# Altium footprint library Package_DFN_QFN.PcbLib: 557 footprints (part 13 of 35)
Each footprint in its own frame and in the unit in brackets; x right, y up, seen from the top. Pads: shape width x height; smd on the part's side, far side on the other; paste and mask are expansions set on the pad; w line width, h text height; cw(c..) or ccw(c..) is an arc to the next point about the centre after c.
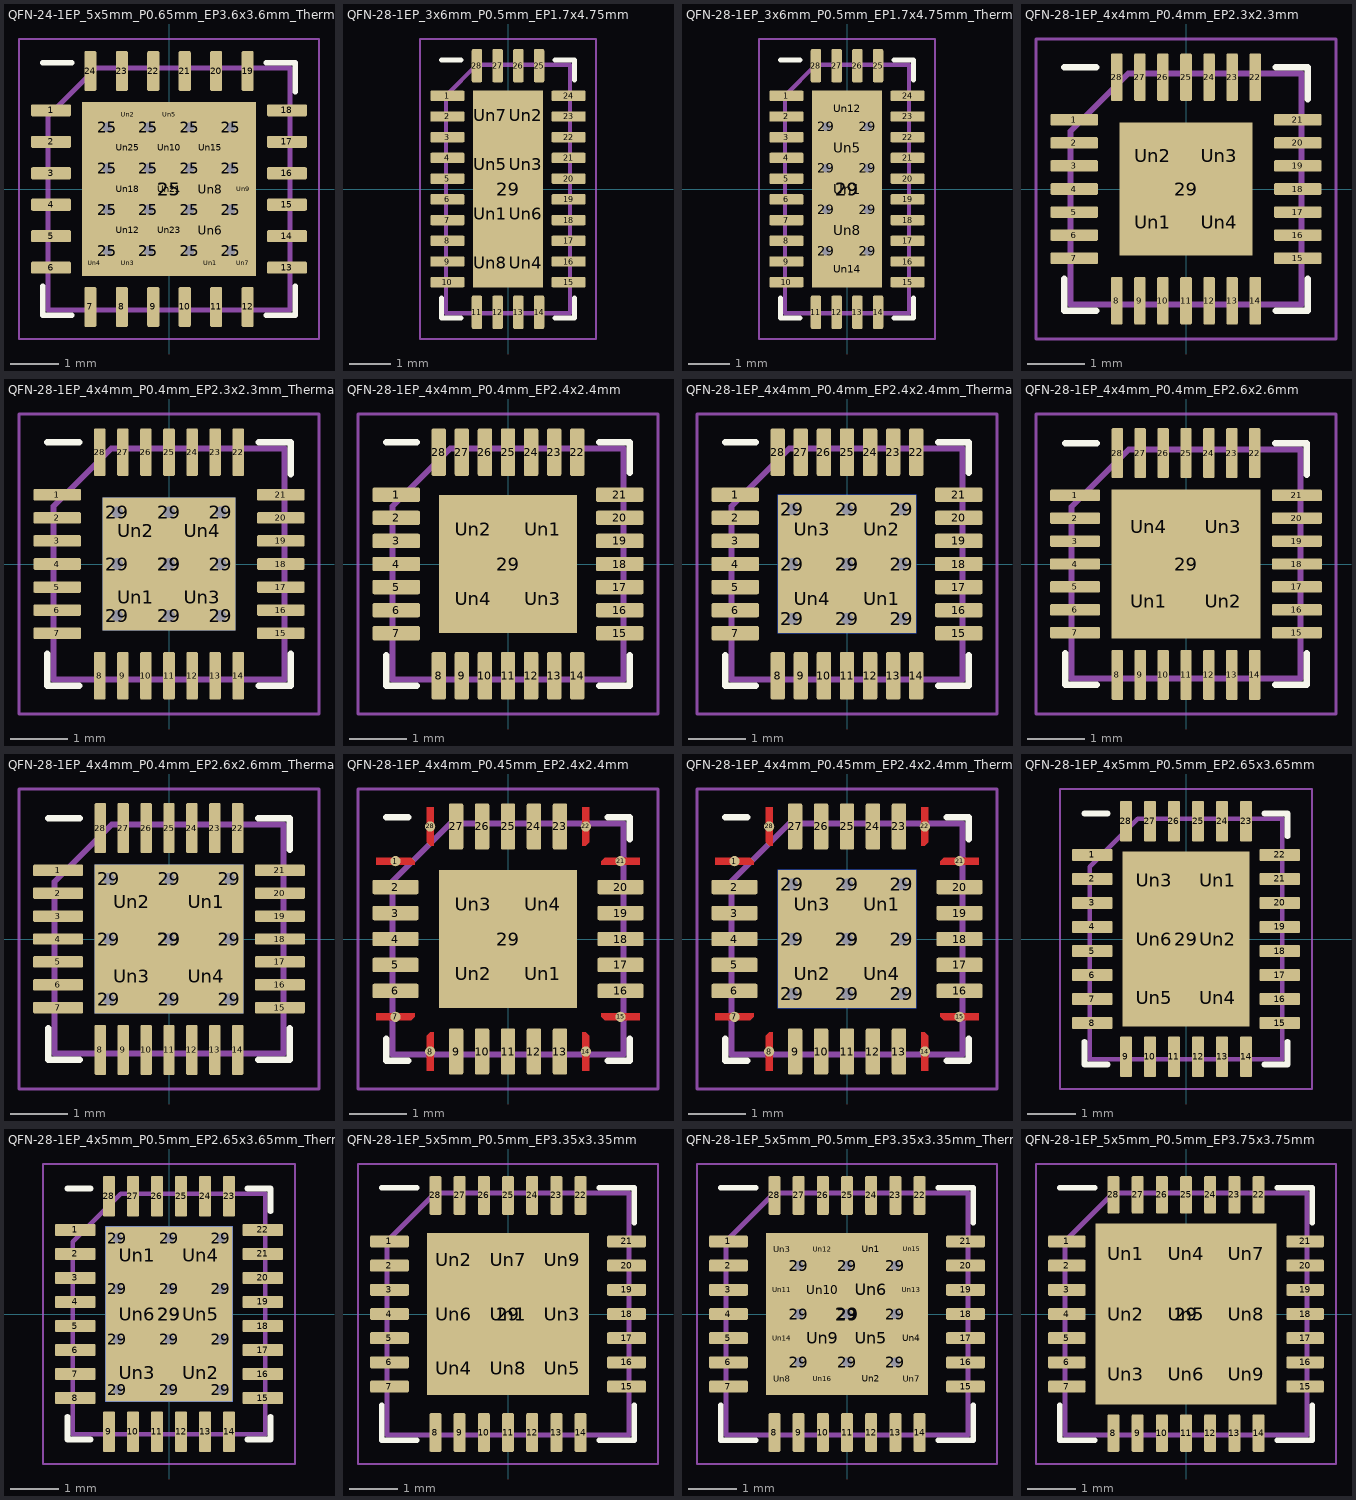
[diagram p12: the footprints below, top view; thin cyan lines are the x and y axes]

## QFN-24-1EP_5x5mm_P0.65mm_EP3.6x3.6mm_ThermalVias [mm]
pads (67):
  rrect25% 0.825x0.25 smd: 1(-2.438,1.625) 2(-2.438,0.975) 3(-2.438,0.325) 4(-2.438,-0.325) 5(-2.438,-0.975) 6(-2.438,-1.625) 13(2.438,-1.625) 14(2.438,-0.975) 15(2.438,-0.325) 16(2.438,0.325) 17(2.438,0.975) 18(2.438,1.625)
  rrect25% 0.25x0.825 smd: 7(-1.625,-2.438) 8(-0.975,-2.438) 9(-0.325,-2.438) 10(0.325,-2.438) 11(0.975,-2.438) 12(1.625,-2.438) 19(1.625,2.438) 20(0.975,2.438) 21(0.325,2.438) 22(-0.325,2.438) 23(-0.975,2.438) 24(-1.625,2.438)
  round 0.5 hole 0.2: 25(-1.275,-1.275) 25(-1.275,-0.425) 25(-1.275,0.425) 25(-1.275,1.275) 25(-0.425,-1.275) 25(-0.425,-0.425) 25(-0.425,0.425) 25(-0.425,1.275) 25(0.425,-1.275) 25(0.425,-0.425) 25(0.425,0.425) 25(0.425,1.275) 25(1.275,-1.275) 25(1.275,-0.425) 25(1.275,0.425) 25(1.275,1.275)
  rect 3.05x3.05 smd far side: 25(0,0)
  rect 3.6x3.6 smd: 25(0,0)
  round 0.317 on Top Paste: Un1(0.85,-1.538) Un2(-0.85,1.538) Un3(-0.85,-1.538) Un5(0,1.538) Un9(1.538,0) Un11(-1.538,0.85) Un13(1.538,0.85) Un14(1.538,-0.85) Un16(0,-1.538) Un17(-1.538,-0.85) Un19(-1.538,0) Un20(0.85,1.538)
  round 0.295 on Top Paste: Un4(-1.538,-1.538) Un7(1.538,-1.538) Un22(1.538,1.538) Un24(-1.538,1.538)
  round 0.602 on Top Paste: Un6(0.85,-0.85) Un8(0.85,0) Un10(0,0.85) Un12(-0.85,-0.85) Un15(0.85,0.85) Un18(-0.85,0) Un21(0,0) Un23(0,-0.85) Un25(-0.85,0.85)
F.SilkS:
  lines w0.12: -2.61,-2.01 -2.61,-2.61 -2.01,-2.61 ; -2.61,2.61 -2.01,2.61 ; 2.01,-2.61 2.61,-2.61 2.61,-2.01 ; 2.01,2.61 2.61,2.61 2.61,2.01
F.Paste:
  drawing of 25 lines, arcs and shapes, not listed
F.CrtYd:
  lines w0.05: -3.1,-3.1 -3.1,3.1 3.1,3.1 3.1,-3.1 -3.1,-3.1
F.Fab:
  lines w0.1: -2.5,-2.5 -2.5,1.5 -1.5,2.5 2.5,2.5 2.5,-2.5 -2.5,-2.5
  text "'.Designator'" at -4.047,-0.84 h1

## QFN-28-1EP_3x6mm_P0.5mm_EP1.7x4.75mm [mm]
pads (37):
  rrect25% 0.825x0.25 smd: 1(-1.462,2.25) 2(-1.462,1.75) 3(-1.462,1.25) 4(-1.462,0.75) 5(-1.462,0.25) 6(-1.462,-0.25) 7(-1.462,-0.75) 8(-1.462,-1.25) 9(-1.462,-1.75) 10(-1.462,-2.25) 15(1.462,-2.25) 16(1.462,-1.75) 17(1.462,-1.25) 18(1.462,-0.75) 19(1.462,-0.25) 20(1.462,0.25) 21(1.462,0.75) 22(1.462,1.25) 23(1.462,1.75) 24(1.462,2.25)
  rrect25% 0.25x0.8 smd: 11(-0.75,-2.975) 12(-0.25,-2.975) 13(0.25,-2.975) 14(0.75,-2.975) 25(0.75,2.975) 26(0.25,2.975) 27(-0.25,2.975) 28(-0.75,2.975)
  rect 1.7x4.75 smd: 29(0,0)
  rrect25% 0.69x0.96 on Top Paste: Un1(-0.425,-0.595) Un2(0.425,1.785) Un3(0.425,0.595) Un4(0.425,-1.785) Un5(-0.425,0.595) Un6(0.425,-0.595) Un7(-0.425,1.785) Un8(-0.425,-1.785)
F.SilkS:
  lines w0.12: -1.61,-2.635 -1.61,-3.11 -1.135,-3.11 ; -1.61,3.11 -1.135,3.11 ; 1.135,-3.11 1.61,-3.11 1.61,-2.635 ; 1.135,3.11 1.61,3.11 1.61,2.635
F.CrtYd:
  lines w0.05: -2.12,-3.62 2.12,-3.62 2.12,3.62 -2.12,3.62 -2.12,-3.62
F.Fab:
  lines w0.1: -1.5,-3 1.5,-3 1.5,3 -0.75,3 -1.5,2.25 -1.5,-3
  text "'.Designator'" at -3.033,-0.628 h0.75

## QFN-28-1EP_3x6mm_P0.5mm_EP1.7x4.75mm_ThermalVias [mm]
pads (53):
  rrect25% 0.825x0.25 smd: 1(-1.462,2.25) 2(-1.462,1.75) 3(-1.462,1.25) 4(-1.462,0.75) 5(-1.462,0.25) 6(-1.462,-0.25) 7(-1.462,-0.75) 8(-1.462,-1.25) 9(-1.462,-1.75) 10(-1.462,-2.25) 15(1.462,-2.25) 16(1.462,-1.75) 17(1.462,-1.25) 18(1.462,-0.75) 19(1.462,-0.25) 20(1.462,0.25) 21(1.462,0.75) 22(1.462,1.25) 23(1.462,1.75) 24(1.462,2.25)
  rrect25% 0.25x0.8 smd: 11(-0.75,-2.975) 12(-0.25,-2.975) 13(0.25,-2.975) 14(0.75,-2.975) 25(0.75,2.975) 26(0.25,2.975) 27(-0.25,2.975) 28(-0.75,2.975)
  round 0.5 hole 0.2: 29(-0.5,-1.5) 29(-0.5,-0.5) 29(-0.5,0.5) 29(-0.5,1.5) 29(0.5,-1.5) 29(0.5,-0.5) 29(0.5,0.5) 29(0.5,1.5)
  rect 1.5x3.5 smd far side: 29(0,0)
  rect 1.7x4.75 smd: 29(0,0)
  rrect25% 0.806x0.806 on Top Paste: Un1(0,0) Un5(0,1) Un8(0,-1)
  round 0.175 on Top Paste: Un2(-0.675,1) Un7(0.675,-1) Un9(0.675,0) Un10(-0.675,0) Un13(-0.675,-1) Un15(0.675,1)
  round 0.166 on Top Paste: Un3(0.675,1.937) Un4(-0.675,-1.937) Un6(0.675,-1.937) Un11(-0.675,1.937)
  rrect25% 0.806x0.705 on Top Paste: Un12(0,1.937) Un14(0,-1.937)
F.SilkS:
  lines w0.12: -1.61,-2.635 -1.61,-3.11 -1.135,-3.11 ; -1.61,3.11 -1.135,3.11 ; 1.135,-3.11 1.61,-3.11 1.61,-2.635 ; 1.135,3.11 1.61,3.11 1.61,2.635
F.Paste:
  region: -0.599,1.224 -0.599,0.776 -0.713,0.662 -0.751,0.662 -0.751,1.338 -0.713,1.338
  region: 0.757,1.644 0.723,1.644 0.593,1.773 0.593,2.231 0.757,2.231
  region: -0.593,-1.773 -0.593,-2.231 -0.757,-2.231 -0.757,-1.644 -0.723,-1.644
  region: 0.757,-2.231 0.593,-2.231 0.593,-1.773 0.723,-1.644 0.757,-1.644
  region: 0.751,-1.338 0.713,-1.338 0.599,-1.224 0.599,-0.776 0.713,-0.662 0.751,-0.662
  region: 0.751,-0.338 0.713,-0.338 0.599,-0.224 0.599,0.224 0.713,0.338 0.751,0.338
  region: -0.599,0.224 -0.599,-0.224 -0.713,-0.338 -0.751,-0.338 -0.751,0.338 -0.713,0.338
  region: -0.593,1.773 -0.723,1.644 -0.757,1.644 -0.757,2.231 -0.593,2.231
  region: -0.599,-0.776 -0.599,-1.224 -0.713,-1.338 -0.751,-1.338 -0.751,-0.662 -0.713,-0.662
  region: 0.751,0.662 0.713,0.662 0.599,0.776 0.599,1.224 0.713,1.338 0.751,1.338
F.CrtYd:
  lines w0.05: -2.12,-3.62 2.12,-3.62 2.12,3.62 -2.12,3.62 -2.12,-3.62
F.Fab:
  lines w0.1: -1.5,-3 -1.5,2.25 -0.75,3 1.5,3 1.5,-3 -1.5,-3
  text "'.Designator'" at -3.033,-0.628 h0.75

## QFN-28-1EP_4x4mm_P0.4mm_EP2.3x2.3mm [mm]
pads (33):
  rrect25% 0.825x0.2 smd: 1(-1.937,1.2) 2(-1.937,0.8) 3(-1.937,0.4) 4(-1.937,0) 5(-1.937,-0.4) 6(-1.937,-0.8) 7(-1.937,-1.2) 15(1.937,-1.2) 16(1.937,-0.8) 17(1.937,-0.4) 18(1.937,0) 19(1.937,0.4) 20(1.937,0.8) 21(1.937,1.2)
  rrect25% 0.2x0.825 smd: 8(-1.2,-1.937) 9(-0.8,-1.937) 10(-0.4,-1.937) 11(0,-1.937) 12(0.4,-1.937) 13(0.8,-1.937) 14(1.2,-1.937) 22(1.2,1.937) 23(0.8,1.937) 24(0.4,1.937) 25(0,1.937) 26(-0.4,1.937) 27(-0.8,1.937) 28(-1.2,1.937)
  rect 2.3x2.3 smd: 29(0,0)
  rrect25% 0.93x0.93 on Top Paste: Un1(-0.575,-0.575) Un2(-0.575,0.575) Un3(0.575,0.575) Un4(0.575,-0.575)
F.SilkS:
  lines w0.12: -2.11,-1.56 -2.11,-2.11 -1.56,-2.11 ; -2.11,2.11 -1.56,2.11 ; 1.56,-2.11 2.11,-2.11 2.11,-1.56 ; 1.56,2.11 2.11,2.11 2.11,1.56
F.CrtYd:
  lines w0.05: -2.6,-2.6 -2.6,2.6 2.6,2.6 2.6,-2.6 -2.6,-2.6
F.Fab:
  lines w0.1: -2,-2 2,-2 2,2 -1,2 -2,1 -2,-2
  text "'.Designator'" at -4.047,-0.84 h1

## QFN-28-1EP_4x4mm_P0.4mm_EP2.3x2.3mm_ThermalVias [mm]
pads (43):
  rrect25% 0.825x0.2 smd: 1(-1.937,1.2) 2(-1.937,0.8) 3(-1.937,0.4) 4(-1.937,0) 5(-1.937,-0.4) 6(-1.937,-0.8) 7(-1.937,-1.2) 15(1.937,-1.2) 16(1.937,-0.8) 17(1.937,-0.4) 18(1.937,0) 19(1.937,0.4) 20(1.937,0.8) 21(1.937,1.2)
  rrect25% 0.2x0.825 smd: 8(-1.2,-1.937) 9(-0.8,-1.937) 10(-0.4,-1.937) 11(0,-1.937) 12(0.4,-1.937) 13(0.8,-1.937) 14(1.2,-1.937) 22(1.2,1.937) 23(0.8,1.937) 24(0.4,1.937) 25(0,1.937) 26(-0.4,1.937) 27(-0.8,1.937) 28(-1.2,1.937)
  round 0.5 hole 0.2: 29(-0.9,-0.9) 29(-0.9,0) 29(-0.9,0.9) 29(0,-0.9) 29(0,0) 29(0,0.9) 29(0.9,-0.9) 29(0.9,0) 29(0.9,0.9)
  rect 2.3x2.3 smd: 29(0,0)
  rect 2.3x2.3 smd far side: 29(0,0)
  rrect25% 1x1 on Top Paste: Un1(-0.575,-0.575) Un2(-0.575,0.575) Un3(0.575,-0.575) Un4(0.575,0.575)
F.SilkS:
  lines w0.12: -2.11,-1.56 -2.11,-2.11 -1.56,-2.11 ; -2.11,2.11 -1.56,2.11 ; 1.56,-2.11 2.11,-2.11 2.11,-1.56 ; 1.56,2.11 2.11,2.11 2.11,1.56
F.CrtYd:
  lines w0.05: -2.6,-2.6 -2.6,2.6 2.6,2.6 2.6,-2.6 -2.6,-2.6
F.Fab:
  lines w0.1: -2,-2 2,-2 2,2 -1,2 -2,1 -2,-2
  text "'.Designator'" at -4.047,-0.84 h1

## QFN-28-1EP_4x4mm_P0.4mm_EP2.4x2.4mm [mm]
pads (33):
  rrect25% 0.825x0.25 smd: 1(-1.937,1.2) 2(-1.937,0.8) 3(-1.937,0.4) 4(-1.937,0) 5(-1.937,-0.4) 6(-1.937,-0.8) 7(-1.937,-1.2) 15(1.937,-1.2) 16(1.937,-0.8) 17(1.937,-0.4) 18(1.937,0) 19(1.937,0.4) 20(1.937,0.8) 21(1.937,1.2)
  rrect25% 0.25x0.825 smd: 8(-1.2,-1.937) 9(-0.8,-1.937) 10(-0.4,-1.937) 11(0,-1.937) 12(0.4,-1.937) 13(0.8,-1.937) 14(1.2,-1.937) 22(1.2,1.937) 23(0.8,1.937) 24(0.4,1.937) 25(0,1.937) 26(-0.4,1.937) 27(-0.8,1.937) 28(-1.2,1.937)
  rect 2.4x2.4 smd: 29(0,0)
  rrect25% 0.97x0.97 on Top Paste: Un1(0.6,0.6) Un2(-0.6,0.6) Un3(0.6,-0.6) Un4(-0.6,-0.6)
F.SilkS:
  lines w0.12: -2.11,-1.585 -2.11,-2.11 -1.585,-2.11 ; -2.11,2.11 -1.585,2.11 ; 1.585,-2.11 2.11,-2.11 2.11,-1.585 ; 1.585,2.11 2.11,2.11 2.11,1.585
F.CrtYd:
  lines w0.05: -2.6,-2.6 2.6,-2.6 2.6,2.6 -2.6,2.6 -2.6,-2.6
F.Fab:
  lines w0.1: -2,-2 -2,1 -1,2 2,2 2,-2 -2,-2
  text "'.Designator'" at -4.047,-0.84 h1

## QFN-28-1EP_4x4mm_P0.4mm_EP2.4x2.4mm_ThermalVias [mm]
pads (43):
  rrect25% 0.825x0.25 smd: 1(-1.937,1.2) 2(-1.937,0.8) 3(-1.937,0.4) 4(-1.937,0) 5(-1.937,-0.4) 6(-1.937,-0.8) 7(-1.937,-1.2) 15(1.937,-1.2) 16(1.937,-0.8) 17(1.937,-0.4) 18(1.937,0) 19(1.937,0.4) 20(1.937,0.8) 21(1.937,1.2)
  rrect25% 0.25x0.825 smd: 8(-1.2,-1.937) 9(-0.8,-1.937) 10(-0.4,-1.937) 11(0,-1.937) 12(0.4,-1.937) 13(0.8,-1.937) 14(1.2,-1.937) 22(1.2,1.937) 23(0.8,1.937) 24(0.4,1.937) 25(0,1.937) 26(-0.4,1.937) 27(-0.8,1.937) 28(-1.2,1.937)
  round 0.5 hole 0.2: 29(-0.95,-0.95) 29(-0.95,0) 29(-0.95,0.95) 29(0,-0.95) 29(0,0) 29(0,0.95) 29(0.95,-0.95) 29(0.95,0) 29(0.95,0.95)
  rect 2.4x2.4 smd: 29(0,0)
  rect 2.4x2.4 smd far side: 29(0,0)
  rrect24% 1.04x1.04 on Top Paste: Un1(0.6,-0.6) Un2(0.6,0.6) Un3(-0.6,0.6) Un4(-0.6,-0.6)
F.SilkS:
  lines w0.12: -2.11,-1.585 -2.11,-2.11 -1.585,-2.11 ; -2.11,2.11 -1.585,2.11 ; 1.585,-2.11 2.11,-2.11 2.11,-1.585 ; 1.585,2.11 2.11,2.11 2.11,1.585
F.CrtYd:
  lines w0.05: -2.6,-2.6 -2.6,2.6 2.6,2.6 2.6,-2.6 -2.6,-2.6
F.Fab:
  lines w0.1: -2,-2 -2,1 -1,2 2,2 2,-2 -2,-2
  text "'.Designator'" at -4.047,-0.84 h1

## QFN-28-1EP_4x4mm_P0.4mm_EP2.6x2.6mm [mm]
pads (33):
  rrect25% 0.875x0.2 smd: 1(-1.937,1.2) 2(-1.937,0.8) 3(-1.937,0.4) 4(-1.937,0) 5(-1.937,-0.4) 6(-1.937,-0.8) 7(-1.937,-1.2) 15(1.937,-1.2) 16(1.937,-0.8) 17(1.937,-0.4) 18(1.937,0) 19(1.937,0.4) 20(1.937,0.8) 21(1.937,1.2)
  rrect25% 0.2x0.875 smd: 8(-1.2,-1.937) 9(-0.8,-1.937) 10(-0.4,-1.937) 11(0,-1.937) 12(0.4,-1.937) 13(0.8,-1.937) 14(1.2,-1.937) 22(1.2,1.937) 23(0.8,1.937) 24(0.4,1.937) 25(0,1.937) 26(-0.4,1.937) 27(-0.8,1.937) 28(-1.2,1.937)
  rect 2.6x2.6 smd: 29(0,0)
  rrect24% 1.05x1.05 on Top Paste: Un1(-0.65,-0.65) Un2(0.65,-0.65) Un3(0.65,0.65) Un4(-0.65,0.65)
F.SilkS:
  lines w0.12: -2.11,-1.56 -2.11,-2.11 -1.56,-2.11 ; -2.11,2.11 -1.56,2.11 ; 1.56,-2.11 2.11,-2.11 2.11,-1.56 ; 1.56,2.11 2.11,2.11 2.11,1.56
F.CrtYd:
  lines w0.05: -2.62,-2.62 -2.62,2.62 2.62,2.62 2.62,-2.62 -2.62,-2.62
F.Fab:
  lines w0.1: -2,-2 2,-2 2,2 -1,2 -2,1 -2,-2
  text "'.Designator'" at -4.047,-0.84 h1

## QFN-28-1EP_4x4mm_P0.4mm_EP2.6x2.6mm_ThermalVias [mm]
pads (43):
  rrect25% 0.875x0.2 smd: 1(-1.937,1.2) 2(-1.937,0.8) 3(-1.937,0.4) 4(-1.937,0) 5(-1.937,-0.4) 6(-1.937,-0.8) 7(-1.937,-1.2) 15(1.937,-1.2) 16(1.937,-0.8) 17(1.937,-0.4) 18(1.937,0) 19(1.937,0.4) 20(1.937,0.8) 21(1.937,1.2)
  rrect25% 0.2x0.875 smd: 8(-1.2,-1.937) 9(-0.8,-1.937) 10(-0.4,-1.937) 11(0,-1.937) 12(0.4,-1.937) 13(0.8,-1.937) 14(1.2,-1.937) 22(1.2,1.937) 23(0.8,1.937) 24(0.4,1.937) 25(0,1.937) 26(-0.4,1.937) 27(-0.8,1.937) 28(-1.2,1.937)
  round 0.5 hole 0.2: 29(-1.05,-1.05) 29(-1.05,0) 29(-1.05,1.05) 29(0,-1.05) 29(0,0) 29(0,1.05) 29(1.05,-1.05) 29(1.05,0) 29(1.05,1.05)
  rect 2.6x2.6 smd far side: 29(0,0)
  rect 2.6x2.6 smd: 29(0,0)
  rrect22% 1.13x1.13 on Top Paste: Un1(0.65,0.65) Un2(-0.65,0.65) Un3(-0.65,-0.65) Un4(0.65,-0.65)
F.SilkS:
  lines w0.12: -2.11,-1.56 -2.11,-2.11 -1.56,-2.11 ; -2.11,2.11 -1.56,2.11 ; 1.56,-2.11 2.11,-2.11 2.11,-1.56 ; 1.56,2.11 2.11,2.11 2.11,1.56
F.CrtYd:
  lines w0.05: -2.62,-2.62 2.62,-2.62 2.62,2.62 -2.62,2.62 -2.62,-2.62
F.Fab:
  lines w0.1: -2,-2 -2,1 -1,2 2,2 2,-2 -2,-2
  text "'.Designator'" at -4.047,-0.84 h1

## QFN-28-1EP_4x4mm_P0.45mm_EP2.4x2.4mm [mm]
pads (33):
  round 0.179 smd: 1(-1.95,1.35) 7(-1.95,-1.35) 8(-1.35,-1.95) 14(1.35,-1.95) 15(1.95,-1.35) 21(1.95,1.35) 22(1.35,1.95) 28(-1.35,1.95)
  rrect25% 0.8x0.25 smd: 2(-1.95,0.9) 3(-1.95,0.45) 4(-1.95,0) 5(-1.95,-0.45) 6(-1.95,-0.9) 16(1.95,-0.9) 17(1.95,-0.45) 18(1.95,0) 19(1.95,0.45) 20(1.95,0.9)
  rrect25% 0.25x0.8 smd: 9(-0.9,-1.95) 10(-0.45,-1.95) 11(0,-1.95) 12(0.45,-1.95) 13(0.9,-1.95) 23(0.9,1.95) 24(0.45,1.95) 25(0,1.95) 26(-0.45,1.95) 27(-0.9,1.95)
  rect 2.4x2.4 smd: 29(0,0)
  rrect25% 0.97x0.97 on Top Paste: Un1(0.6,-0.6) Un2(-0.6,-0.6) Un3(-0.6,0.6) Un4(0.6,0.6)
F.Cu:
  region: -1.613,1.349 -1.613,1.288 -2.288,1.288 -2.288,1.412 -1.676,1.412
  region: -1.613,-1.349 -1.676,-1.412 -2.288,-1.412 -2.288,-1.288 -1.613,-1.288
  region: -1.288,-2.288 -1.412,-2.288 -1.412,-1.676 -1.349,-1.613 -1.288,-1.613
  region: 1.412,-1.676 1.412,-2.288 1.288,-2.288 1.288,-1.613 1.349,-1.613
  region: 2.288,-1.412 1.676,-1.412 1.613,-1.349 1.613,-1.288 2.288,-1.288
  region: 2.288,1.288 1.613,1.288 1.613,1.349 1.676,1.412 2.288,1.412
  region: 1.412,1.676 1.349,1.613 1.288,1.613 1.288,2.288 1.412,2.288
  region: -1.288,1.613 -1.349,1.613 -1.412,1.676 -1.412,2.288 -1.288,2.288
F.SilkS:
  lines w0.12: -2.11,-1.735 -2.11,-2.11 -1.735,-2.11 ; -2.11,2.11 -1.735,2.11 ; 1.735,-2.11 2.11,-2.11 2.11,-1.735 ; 1.735,2.11 2.11,2.11 2.11,1.735
F.Paste:
  region: -1.613,1.349 -1.613,1.288 -2.288,1.288 -2.288,1.412 -1.676,1.412
  region: -1.613,-1.349 -1.676,-1.412 -2.288,-1.412 -2.288,-1.288 -1.613,-1.288
  region: -1.288,-2.288 -1.412,-2.288 -1.412,-1.676 -1.349,-1.613 -1.288,-1.613
  region: 1.412,-1.676 1.412,-2.288 1.288,-2.288 1.288,-1.613 1.349,-1.613
  region: 2.288,-1.412 1.676,-1.412 1.613,-1.349 1.613,-1.288 2.288,-1.288
  region: 2.288,1.288 1.613,1.288 1.613,1.349 1.676,1.412 2.288,1.412
  region: 1.412,1.676 1.349,1.613 1.288,1.613 1.288,2.288 1.412,2.288
  region: -1.288,1.613 -1.349,1.613 -1.412,1.676 -1.412,2.288 -1.288,2.288
F.Mask:
  region: -1.613,1.349 -1.613,1.288 -2.288,1.288 -2.288,1.412 -1.676,1.412
  region: -1.613,-1.349 -1.676,-1.412 -2.288,-1.412 -2.288,-1.288 -1.613,-1.288
  region: -1.288,-2.288 -1.412,-2.288 -1.412,-1.676 -1.349,-1.613 -1.288,-1.613
  region: 1.412,-1.676 1.412,-2.288 1.288,-2.288 1.288,-1.613 1.349,-1.613
  region: 2.288,-1.412 1.676,-1.412 1.613,-1.349 1.613,-1.288 2.288,-1.288
  region: 2.288,1.288 1.613,1.288 1.613,1.349 1.676,1.412 2.288,1.412
  region: 1.412,1.676 1.349,1.613 1.288,1.613 1.288,2.288 1.412,2.288
  region: -1.288,1.613 -1.349,1.613 -1.412,1.676 -1.412,2.288 -1.288,2.288
F.CrtYd:
  lines w0.05: -2.6,-2.6 2.6,-2.6 2.6,2.6 -2.6,2.6 -2.6,-2.6
F.Fab:
  lines w0.1: -2,-2 2,-2 2,2 -1,2 -2,1 -2,-2
  text "'.Designator'" at -4.047,-0.84 h1

## QFN-28-1EP_4x4mm_P0.45mm_EP2.4x2.4mm_ThermalVias [mm]
pads (43):
  round 0.179 smd: 1(-1.95,1.35) 7(-1.95,-1.35) 8(-1.35,-1.95) 14(1.35,-1.95) 15(1.95,-1.35) 21(1.95,1.35) 22(1.35,1.95) 28(-1.35,1.95)
  rrect25% 0.8x0.25 smd: 2(-1.95,0.9) 3(-1.95,0.45) 4(-1.95,0) 5(-1.95,-0.45) 6(-1.95,-0.9) 16(1.95,-0.9) 17(1.95,-0.45) 18(1.95,0) 19(1.95,0.45) 20(1.95,0.9)
  rrect25% 0.25x0.8 smd: 9(-0.9,-1.95) 10(-0.45,-1.95) 11(0,-1.95) 12(0.45,-1.95) 13(0.9,-1.95) 23(0.9,1.95) 24(0.45,1.95) 25(0,1.95) 26(-0.45,1.95) 27(-0.9,1.95)
  round 0.5 hole 0.2: 29(-0.95,-0.95) 29(-0.95,0) 29(-0.95,0.95) 29(0,-0.95) 29(0,0) 29(0,0.95) 29(0.95,-0.95) 29(0.95,0) 29(0.95,0.95)
  rect 2.4x2.4 smd far side: 29(0,0)
  rect 2.4x2.4 smd: 29(0,0)
  rrect24% 1.04x1.04 on Top Paste: Un1(0.6,0.6) Un2(-0.6,-0.6) Un3(-0.6,0.6) Un4(0.6,-0.6)
F.Cu:
  region: -1.613,1.349 -1.613,1.288 -2.288,1.288 -2.288,1.412 -1.676,1.412
  region: -1.613,-1.349 -1.676,-1.412 -2.288,-1.412 -2.288,-1.288 -1.613,-1.288
  region: -1.288,-2.288 -1.412,-2.288 -1.412,-1.676 -1.349,-1.613 -1.288,-1.613
  region: 1.412,-1.676 1.412,-2.288 1.288,-2.288 1.288,-1.613 1.349,-1.613
  region: 2.288,-1.412 1.676,-1.412 1.613,-1.349 1.613,-1.288 2.288,-1.288
  region: 2.288,1.288 1.613,1.288 1.613,1.349 1.676,1.412 2.288,1.412
  region: 1.412,1.676 1.349,1.613 1.288,1.613 1.288,2.288 1.412,2.288
  region: -1.288,1.613 -1.349,1.613 -1.412,1.676 -1.412,2.288 -1.288,2.288
F.SilkS:
  lines w0.12: -2.11,-1.735 -2.11,-2.11 -1.735,-2.11 ; -2.11,2.11 -1.735,2.11 ; 1.735,-2.11 2.11,-2.11 2.11,-1.735 ; 1.735,2.11 2.11,2.11 2.11,1.735
F.Paste:
  region: -1.613,1.349 -1.613,1.288 -2.288,1.288 -2.288,1.412 -1.676,1.412
  region: -1.613,-1.349 -1.676,-1.412 -2.288,-1.412 -2.288,-1.288 -1.613,-1.288
  region: -1.288,-2.288 -1.412,-2.288 -1.412,-1.676 -1.349,-1.613 -1.288,-1.613
  region: 1.412,-1.676 1.412,-2.288 1.288,-2.288 1.288,-1.613 1.349,-1.613
  region: 2.288,-1.412 1.676,-1.412 1.613,-1.349 1.613,-1.288 2.288,-1.288
  region: 2.288,1.288 1.613,1.288 1.613,1.349 1.676,1.412 2.288,1.412
  region: 1.412,1.676 1.349,1.613 1.288,1.613 1.288,2.288 1.412,2.288
  region: -1.288,1.613 -1.349,1.613 -1.412,1.676 -1.412,2.288 -1.288,2.288
F.Mask:
  region: -1.613,1.349 -1.613,1.288 -2.288,1.288 -2.288,1.412 -1.676,1.412
  region: -1.613,-1.349 -1.676,-1.412 -2.288,-1.412 -2.288,-1.288 -1.613,-1.288
  region: -1.288,-2.288 -1.412,-2.288 -1.412,-1.676 -1.349,-1.613 -1.288,-1.613
  region: 1.412,-1.676 1.412,-2.288 1.288,-2.288 1.288,-1.613 1.349,-1.613
  region: 2.288,-1.412 1.676,-1.412 1.613,-1.349 1.613,-1.288 2.288,-1.288
  region: 2.288,1.288 1.613,1.288 1.613,1.349 1.676,1.412 2.288,1.412
  region: 1.412,1.676 1.349,1.613 1.288,1.613 1.288,2.288 1.412,2.288
  region: -1.288,1.613 -1.349,1.613 -1.412,1.676 -1.412,2.288 -1.288,2.288
F.CrtYd:
  lines w0.05: -2.6,-2.6 -2.6,2.6 2.6,2.6 2.6,-2.6 -2.6,-2.6
F.Fab:
  lines w0.1: -2,-2 2,-2 2,2 -1,2 -2,1 -2,-2
  text "'.Designator'" at -4.047,-0.84 h1

## QFN-28-1EP_4x5mm_P0.5mm_EP2.65x3.65mm [mm]
pads (35):
  rrect25% 0.85x0.25 smd: 1(-1.95,1.75) 2(-1.95,1.25) 3(-1.95,0.75) 4(-1.95,0.25) 5(-1.95,-0.25) 6(-1.95,-0.75) 7(-1.95,-1.25) 8(-1.95,-1.75) 15(1.95,-1.75) 16(1.95,-1.25) 17(1.95,-0.75) 18(1.95,-0.25) 19(1.95,0.25) 20(1.95,0.75) 21(1.95,1.25) 22(1.95,1.75)
  rrect25% 0.25x0.85 smd: 9(-1.25,-2.45) 10(-0.75,-2.45) 11(-0.25,-2.45) 12(0.25,-2.45) 13(0.75,-2.45) 14(1.25,-2.45) 23(1.25,2.45) 24(0.75,2.45) 25(0.25,2.45) 26(-0.25,2.45) 27(-0.75,2.45) 28(-1.25,2.45)
  rect 2.65x3.65 smd: 29(0,0)
  rrect25% 1.07x0.98 on Top Paste: Un1(0.66,1.22) Un2(0.66,0) Un3(-0.66,1.22) Un4(0.66,-1.22) Un5(-0.66,-1.22) Un6(-0.66,0)
F.SilkS:
  lines w0.12: -2.11,-2.135 -2.11,-2.61 -1.635,-2.61 ; -2.11,2.61 -1.635,2.61 ; 1.635,-2.61 2.11,-2.61 2.11,-2.135 ; 1.635,2.61 2.11,2.61 2.11,2.135
F.CrtYd:
  lines w0.05: -2.62,-3.12 2.62,-3.12 2.62,3.12 -2.62,3.12 -2.62,-3.12
F.Fab:
  lines w0.1: -2,-2.5 -2,1.5 -1,2.5 2,2.5 2,-2.5 -2,-2.5
  text "'.Designator'" at -4.047,-0.84 h1

## QFN-28-1EP_4x5mm_P0.5mm_EP2.65x3.65mm_ThermalVias [mm]
pads (48):
  rrect25% 0.85x0.25 smd: 1(-1.95,1.75) 2(-1.95,1.25) 3(-1.95,0.75) 4(-1.95,0.25) 5(-1.95,-0.25) 6(-1.95,-0.75) 7(-1.95,-1.25) 8(-1.95,-1.75) 15(1.95,-1.75) 16(1.95,-1.25) 17(1.95,-0.75) 18(1.95,-0.25) 19(1.95,0.25) 20(1.95,0.75) 21(1.95,1.25) 22(1.95,1.75)
  rrect25% 0.25x0.85 smd: 9(-1.25,-2.45) 10(-0.75,-2.45) 11(-0.25,-2.45) 12(0.25,-2.45) 13(0.75,-2.45) 14(1.25,-2.45) 23(1.25,2.45) 24(0.75,2.45) 25(0.25,2.45) 26(-0.25,2.45) 27(-0.75,2.45) 28(-1.25,2.45)
  round 0.5 hole 0.2: 29(-1.075,-1.575) 29(-1.075,-0.525) 29(-1.075,0.525) 29(-1.075,1.575) 29(0,-1.575) 29(0,-0.525) 29(0,0.525) 29(0,1.575) 29(1.075,-1.575) 29(1.075,-0.525) 29(1.075,0.525) 29(1.075,1.575)
  rect 2.65x3.65 smd: 29(0,0)
  rect 2.65x3.65 smd far side: 29(0,0)
  rrect25% 1.07x0.98 on Top Paste: Un1(-0.66,1.22) Un2(0.66,-1.22) Un3(-0.66,-1.22) Un4(0.66,1.22) Un5(0.66,0) Un6(-0.66,0)
F.SilkS:
  lines w0.12: -2.11,-2.135 -2.11,-2.61 -1.635,-2.61 ; -2.11,2.61 -1.635,2.61 ; 1.635,-2.61 2.11,-2.61 2.11,-2.135 ; 1.635,2.61 2.11,2.61 2.11,2.135
F.CrtYd:
  lines w0.05: -2.62,-3.12 2.62,-3.12 2.62,3.12 -2.62,3.12 -2.62,-3.12
F.Fab:
  lines w0.1: -2,-2.5 -2,1.5 -1,2.5 2,2.5 2,-2.5 -2,-2.5
  text "'.Designator'" at -4.047,-0.84 h1

## QFN-28-1EP_5x5mm_P0.5mm_EP3.35x3.35mm [mm]
pads (38):
  rrect25% 0.8x0.25 smd: 1(-2.45,1.5) 2(-2.45,1) 3(-2.45,0.5) 4(-2.45,0) 5(-2.45,-0.5) 6(-2.45,-1) 7(-2.45,-1.5) 15(2.45,-1.5) 16(2.45,-1) 17(2.45,-0.5) 18(2.45,0) 19(2.45,0.5) 20(2.45,1) 21(2.45,1.5)
  rrect25% 0.25x0.8 smd: 8(-1.5,-2.45) 9(-1,-2.45) 10(-0.5,-2.45) 11(0,-2.45) 12(0.5,-2.45) 13(1,-2.45) 14(1.5,-2.45) 22(1.5,2.45) 23(1,2.45) 24(0.5,2.45) 25(0,2.45) 26(-0.5,2.45) 27(-1,2.45) 28(-1.5,2.45)
  rect 3.35x3.35 smd: 29(0,0)
  rrect25% 0.9x0.9 on Top Paste: Un1(0,0) Un2(-1.12,1.12) Un3(1.12,0) Un4(-1.12,-1.12) Un5(1.12,-1.12) Un6(-1.12,0) Un7(0,1.12) Un8(0,-1.12) Un9(1.12,1.12)
F.SilkS:
  lines w0.12: -2.61,-1.885 -2.61,-2.61 -1.885,-2.61 ; -2.61,2.61 -1.885,2.61 ; 1.885,-2.61 2.61,-2.61 2.61,-1.885 ; 1.885,2.61 2.61,2.61 2.61,1.885
F.CrtYd:
  lines w0.05: -3.1,-3.1 3.1,-3.1 3.1,3.1 -3.1,3.1 -3.1,-3.1
F.Fab:
  lines w0.1: -2.5,-2.5 -2.5,1.5 -1.5,2.5 2.5,2.5 2.5,-2.5 -2.5,-2.5
  text "'.Designator'" at -4.047,-0.84 h1

## QFN-28-1EP_5x5mm_P0.5mm_EP3.35x3.35mm_ThermalVias [mm]
pads (55):
  rrect25% 0.8x0.25 smd: 1(-2.45,1.5) 2(-2.45,1) 3(-2.45,0.5) 4(-2.45,0) 5(-2.45,-0.5) 6(-2.45,-1) 7(-2.45,-1.5) 15(2.45,-1.5) 16(2.45,-1) 17(2.45,-0.5) 18(2.45,0) 19(2.45,0.5) 20(2.45,1) 21(2.45,1.5)
  rrect25% 0.25x0.8 smd: 8(-1.5,-2.45) 9(-1,-2.45) 10(-0.5,-2.45) 11(0,-2.45) 12(0.5,-2.45) 13(1,-2.45) 14(1.5,-2.45) 22(1.5,2.45) 23(1,2.45) 24(0.5,2.45) 25(0,2.45) 26(-0.5,2.45) 27(-1,2.45) 28(-1.5,2.45)
  round 0.5 hole 0.2: 29(-1,-1) 29(-1,0) 29(-1,1) 29(0,-1) 29(0,0) 29(0,1) 29(1,-1) 29(1,0) 29(1,1)
  rect 3.35x3.35 smd: 29(0,0)
  rect 2.5x2.5 smd far side: 29(0,0)
  round 0.459 on Top Paste: Un1(0.5,1.338) Un2(0.5,-1.338) Un4(1.338,-0.5) Un11(-1.338,0.5) Un12(-0.5,1.338) Un13(1.338,0.5) Un14(-1.338,-0.5) Un16(-0.5,-1.338)
  round 0.437 on Top Paste: Un3(-1.338,1.338) Un7(1.338,-1.338) Un8(-1.338,-1.338) Un15(1.338,1.338)
  rrect25% 0.806x0.806 on Top Paste: Un5(0.5,-0.5) Un6(0.5,0.5) Un9(-0.5,-0.5) Un10(-0.5,0.5)
F.SilkS:
  lines w0.12: -2.61,-1.885 -2.61,-2.61 -1.885,-2.61 ; -2.61,2.61 -1.885,2.61 ; 1.885,-2.61 2.61,-2.61 2.61,-1.885 ; 1.885,2.61 2.61,2.61 2.61,1.885
F.Paste:
  region: 0.818,1.221 0.747,1.151 0.253,1.151 0.182,1.221 0.182,1.524 0.818,1.524
  region: 0.818,-1.221 0.818,-1.524 0.182,-1.524 0.182,-1.221 0.253,-1.151 0.747,-1.151
  region: -1.173,1.262 -1.262,1.173 -1.502,1.173 -1.502,1.502 -1.173,1.502
  region: 1.524,-0.818 1.221,-0.818 1.151,-0.747 1.151,-0.253 1.221,-0.182 1.524,-0.182
  region: 1.502,-1.502 1.173,-1.502 1.173,-1.262 1.262,-1.173 1.502,-1.173
  region: -1.173,-1.262 -1.173,-1.502 -1.502,-1.502 -1.502,-1.173 -1.262,-1.173
  region: -1.151,0.747 -1.151,0.253 -1.221,0.182 -1.524,0.182 -1.524,0.818 -1.221,0.818
  region: -0.182,1.221 -0.253,1.151 -0.747,1.151 -0.818,1.221 -0.818,1.524 -0.182,1.524
  region: 1.524,0.182 1.221,0.182 1.151,0.253 1.151,0.747 1.221,0.818 1.524,0.818
  region: -1.151,-0.253 -1.151,-0.747 -1.221,-0.818 -1.524,-0.818 -1.524,-0.182 -1.221,-0.182
  region: 1.502,1.173 1.262,1.173 1.173,1.262 1.173,1.502 1.502,1.502
  region: -0.182,-1.221 -0.182,-1.524 -0.818,-1.524 -0.818,-1.221 -0.747,-1.151 -0.253,-1.151
F.CrtYd:
  lines w0.05: -3.1,-3.1 3.1,-3.1 3.1,3.1 -3.1,3.1 -3.1,-3.1
F.Fab:
  lines w0.1: -2.5,-2.5 2.5,-2.5 2.5,2.5 -1.5,2.5 -2.5,1.5 -2.5,-2.5
  text "'.Designator'" at -4.047,-0.84 h1

## QFN-28-1EP_5x5mm_P0.5mm_EP3.75x3.75mm [mm]
pads (38):
  rrect25% 0.775x0.25 smd: 1(-2.462,1.5) 2(-2.462,1) 3(-2.462,0.5) 4(-2.462,0) 5(-2.462,-0.5) 6(-2.462,-1) 7(-2.462,-1.5) 15(2.462,-1.5) 16(2.462,-1) 17(2.462,-0.5) 18(2.462,0) 19(2.462,0.5) 20(2.462,1) 21(2.462,1.5)
  rrect25% 0.25x0.775 smd: 8(-1.5,-2.462) 9(-1,-2.462) 10(-0.5,-2.462) 11(0,-2.462) 12(0.5,-2.462) 13(1,-2.462) 14(1.5,-2.462) 22(1.5,2.462) 23(1,2.462) 24(0.5,2.462) 25(0,2.462) 26(-0.5,2.462) 27(-1,2.462) 28(-1.5,2.462)
  rect 3.75x3.75 smd: 29(0,0)
  rrect25% 1.01x1.01 on Top Paste: Un1(-1.25,1.25) Un2(-1.25,0) Un3(-1.25,-1.25) Un4(0,1.25) Un5(0,0) Un6(0,-1.25) Un7(1.25,1.25) Un8(1.25,0) Un9(1.25,-1.25)
F.SilkS:
  lines w0.12: -2.61,-1.885 -2.61,-2.61 -1.885,-2.61 ; -2.61,2.61 -1.885,2.61 ; 1.885,-2.61 2.61,-2.61 2.61,-1.885 ; 1.885,2.61 2.61,2.61 2.61,1.885
F.CrtYd:
  lines w0.05: -3.1,-3.1 -3.1,3.1 3.1,3.1 3.1,-3.1 -3.1,-3.1
F.Fab:
  lines w0.1: -2.5,-2.5 2.5,-2.5 2.5,2.5 -1.5,2.5 -2.5,1.5 -2.5,-2.5
  text "'.Designator'" at -4.047,-0.84 h1